# Altium footprint library North POLE.PcbLib: 419 footprints (part 26 of 27)
Each footprint in its own frame and in the unit in brackets; x right, y up, seen from the top. Pads: shape width x height; smd on the part's side, far side on the other; paste and mask are expansions set on the pad; w line width, h text height; cw(c..) or ccw(c..) is an arc to the next point about the centre after c.
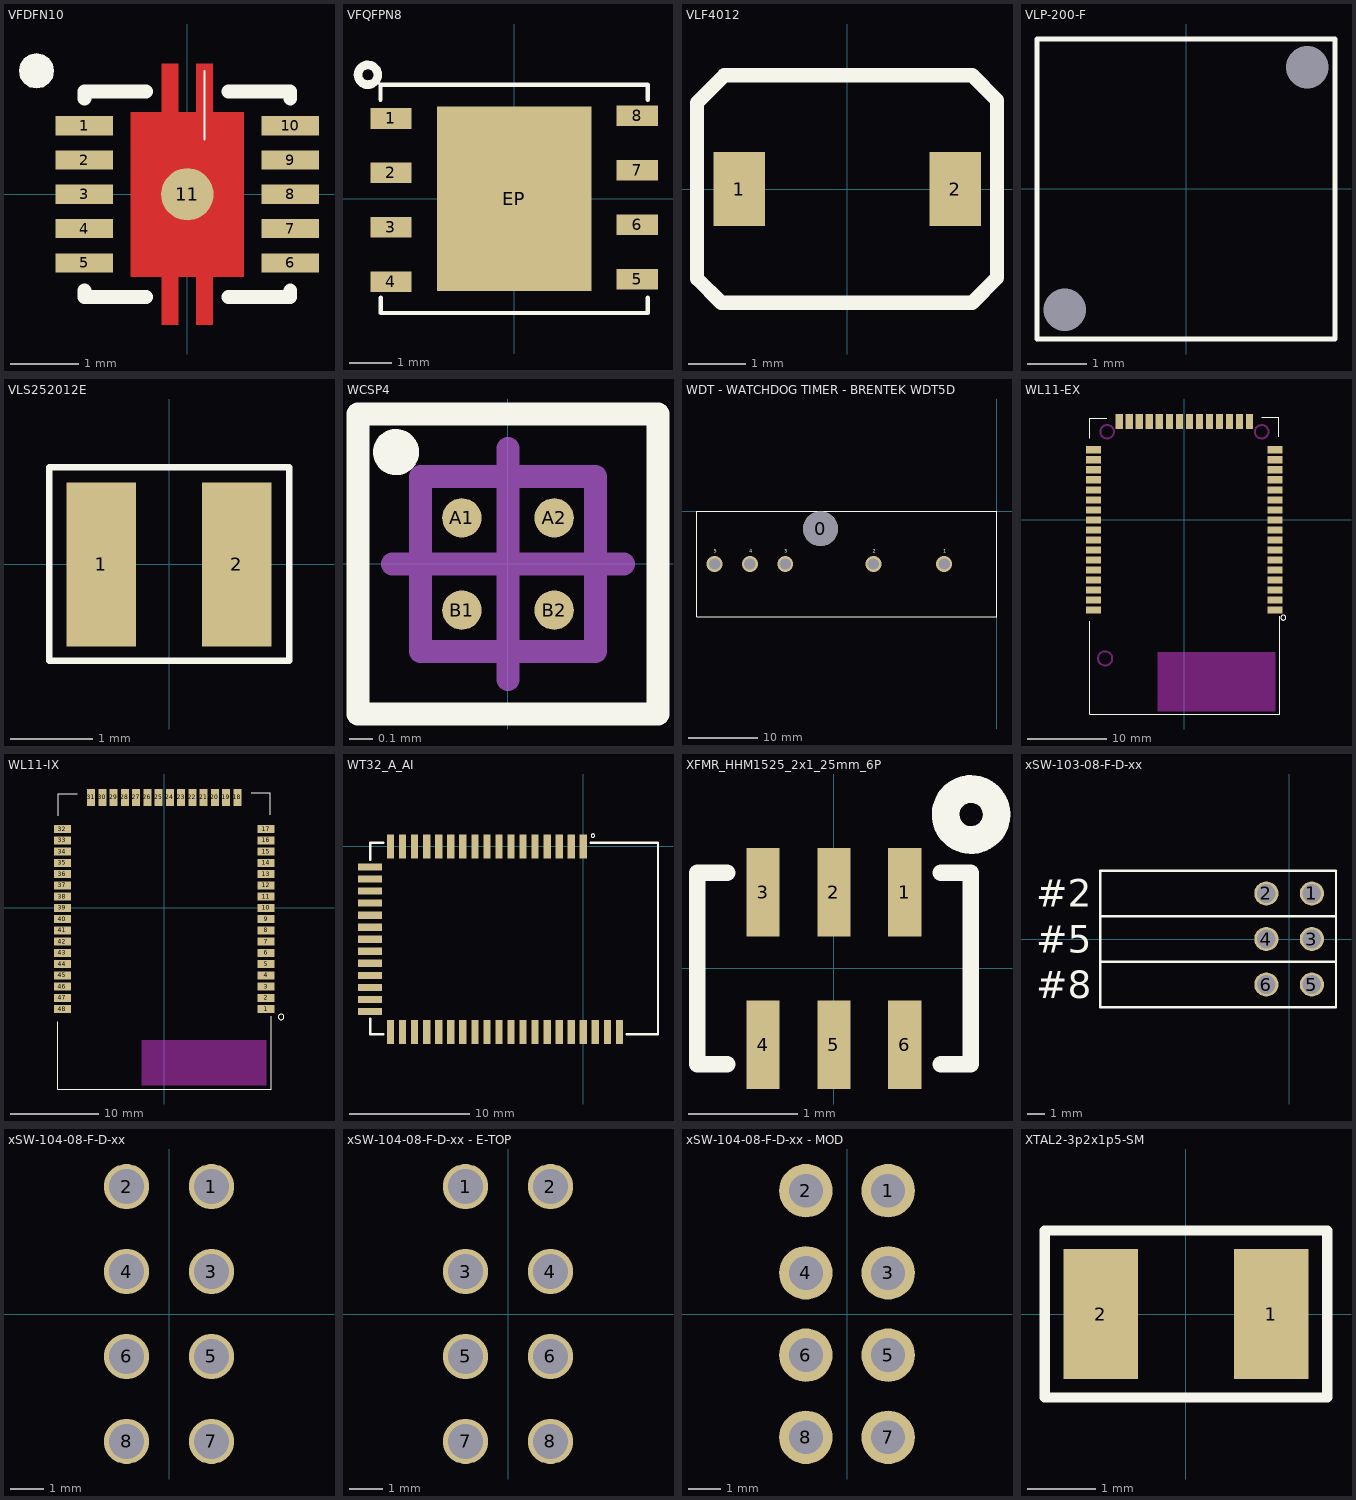
[diagram p25: the footprints below, top view; thin cyan lines are the x and y axes]

## VFDFN10 [mil]
pads (11):
  rect 33x11 smd paste+0 mask+5: 1(-59.06,39.37) 2(-59.06,19.68) 3(-59.06,0) 4(-59.06,-19.68) 5(-59.06,-39.37) 6(59.06,-39.37) 7(59.06,-19.68) 8(59.06,0) 9(59.06,19.68) 10(59.06,39.37)
  round 30 smd paste+0 mask+5: 11(0,0)
Top Layer:
  region: -32.48,-47.24 -32.48,47.24 -14.57,47.24 -14.57,74.8 -5.12,74.8 -5.12,47.24 5.12,47.24 5.12,74.8 14.57,74.8 14.57,47.24 32.48,47.24 32.48,-47.24 14.57,-47.24 14.57,-74.8 5.12,-74.8 5.12,-47.24 -5.12,-47.24 -5.12,-74.8 -14.57,-74.8 -14.57,-47.24
Top Overlay:
  region: -86.61,60.83 -90.45,61.59 -93.71,63.77 -95.89,67.03 -96.65,70.87 -95.89,74.71 -93.71,77.96 -90.45,80.14 -86.61,80.9 -82.77,80.14 -79.52,77.96 -77.34,74.71 -76.58,70.87 -77.34,67.03 -79.52,63.77 -82.77,61.59
  lines w1: 9.84,31.5 9.84,70.87
  lines w8: -59.06,-55.12 -59.06,-59.06 -23.62,-59.06 ; -59.06,55.12 -59.06,59.06 -23.62,59.06 ; 23.62,-59.06 59.06,-59.06 59.06,-55.12 ; 23.62,59.06 59.06,59.06 59.06,55.12
Top Paste:
  region: -27.56,-43.31 27.56,-43.31 27.56,-23.62 -27.56,-23.62
  region: -27.56,23.62 27.56,23.62 27.56,43.31 -27.56,43.31
  region: -27.56,-7.87 27.56,-7.87 27.56,11.81 -27.56,11.81
Top Solder:
  region: -32.48,-47.24 -32.48,47.24 -14.57,47.24 -14.57,74.8 -5.12,74.8 -5.12,47.24 5.12,47.24 5.12,74.8 14.57,74.8 14.57,47.24 32.48,47.24 32.48,-47.24 14.57,-47.24 14.57,-74.8 5.12,-74.8 5.12,-47.24 -5.12,-47.24 -5.12,-74.8 -14.57,-74.8 -14.57,-47.24

## VFQFPN8 [mm]
pads (9):
  rect 0.965x0.48 smd mask+0.08: 1(-2.873,1.875) 2(-2.873,0.605) 3(-2.873,-0.665) 4(-2.873,-1.935) 5(2.873,-1.875) 6(2.873,-0.605) 7(2.873,0.665) 8(2.873,1.935)
  rect 3.6x4.3 smd mask+0.08: EP(0,0)
Top Overlay:
  lines w0.1: -3.119,2.309 -3.119,2.664 3.114,2.664 3.114,2.309 ; -3.114,-2.309 -3.114,-2.664 3.119,-2.664 3.119,-2.309
  lines w0.2: -3.331,3.11 ccw(c-3.411,2.894) -3.327,3.109
3D body: height 0.85, standoff 0, extent -3,-2.5 3,2.5

## VLF4012 [mm] "TDK VLF4012A SMD Inductor"
height 1.2
pads (2):
  rect 0.9x1.3 smd: 1(-1.9,0) 2(1.9,0)
Top Overlay:
  lines w0.254: -2.643,-1.575 -2.218,-2 2.196,-2 2.634,-1.562 2.634,1.562 2.196,2 -2.16,2 -2.643,1.518 -2.643,-1.575
3D body: height 1.2, standoff 0, extent -2.351,-1.721 2.348,1.727

## VLP-200-F [mil]
pads (2):
  round 24 hole 28 unplated mask+3.15: ""(-80,-80) ""(80,80)
Top Overlay:
  lines w3: -98.43,-99.37 98.39,-99.37 98.39,98.78 -98.43,98.78 -98.43,-99.37
3D body: height 399.86, standoff -60.14, extent -92.49,-92.49 92.51,92.51

## VLS252012E [mm]
pads (2):
  rect 0.85x2 smd mask+0.08: 1(-0.825,0) 2(0.825,0)
Top Overlay:
  lines w0.076: -1.456,-1.173 -1.456,1.184 1.463,1.184 1.463,-1.173 -1.456,-1.173
3D body: height 1.2, standoff 0, extent -1.25,-1.002 1.25,1

## WCSP4 [mm] "BGA, 4-Leads, Body 0.76x0.76mmx0.50mm, Pitch 0.40mm"
height 0.5
pads (4):
  round 0.17 smd: A1(-0.2,0.2) A2(0.2,0.2) B1(-0.2,-0.2) B2(0.2,-0.2)
Top Overlay:
  circle w0.1: c-0.485,0.485 r0.05
  lines w0.1: -0.65,-0.65 0.65,-0.65 0.65,0.65 -0.65,0.65 -0.65,-0.65
Mechanical 13:
  lines w0.1: -0.38,-0.38 0.38,-0.38 0.38,0.38 -0.38,0.38 -0.38,-0.38
Mechanical 15:
  lines w0.05: -0.65,-0.65 0.65,-0.65 0.65,0.65 -0.65,0.65 -0.65,-0.65
  lines w0.1: -0.5,0 0.5,0 ; 0,-0.5 0,0.5
3D body: height 0.5, standoff 0.13, extent -0.38,-0.38 0.38,0.38

## WDT - WATCHDOG TIMER - BRENTEK WDT5D [mm]
pads (1):
  round 5 hole 5 unplated: 0(-25.4,-2.54)
via -40.64,-7.62 diameter 2.286 hole 1.651
via -35.56,-7.62 diameter 2.286 hole 1.651
via -30.48,-7.62 diameter 2.286 hole 1.651
via -17.78,-7.62 diameter 2.286 hole 1.651
via -7.62,-7.62 diameter 2.286 hole 1.651
Top Overlay:
  lines w0.127: -43.18,-15.24 -43.18,0 0,0 0,-15.24 -43.18,-15.24
  text "5" at -40.767,-6.02 h0.5
  text "4" at -35.687,-6.02 h0.5
  text "3" at -30.607,-6.02 h0.5
  text "2" at -17.907,-6.02 h0.5
  text "1" at -7.747,-6.02 h0.5

## WL11-EX [mil]
pads (48):
  rect 75x36 smd mask+3.15: 1(452.5,-450) 2(452.5,-400) 3(452.5,-350) 4(452.5,-300) 5(452.5,-250) 6(452.5,-200) 7(452.5,-150) 8(452.5,-100) 9(452.5,-50) 10(452.5,0) 11(452.5,50) 12(452.5,100) 13(452.5,150) 14(452.5,200) 15(452.5,250) 16(452.5,300) 17(452.5,350) 32(-452.5,350) 33(-452.5,300) 34(-452.5,250) 35(-452.5,200) 36(-452.5,150) 37(-452.5,100) 38(-452.5,50) 39(-452.5,0) 40(-452.5,-50) 41(-452.5,-100) 42(-452.5,-150) 43(-452.5,-200) 44(-452.5,-250) 45(-452.5,-300) 46(-452.5,-350) 47(-452.5,-400) 48(-452.5,-450)
  rect 36x75 smd mask+3.15: 18(325,491.06) 19(275,491.06) 20(225,491.06) 21(175,491.06) 22(125,491.06) 23(75,491.06) 24(25,491.06) 25(-25,491.06) 26(-75,491.06) 27(-125,491.06) 28(-175,491.06) 29(-225,491.06) 30(-275,491.06) 31(-325,491.06)
Top Overlay:
  lines w5: -472.7,-506.7 -472.7,-968.5 475.9,-968.5 475.9,-481.5 ; -472,408.6 -472,508.5 -387.4,508.5 ; 387.1,512.2 471.4,512.2 471.4,414.5 ; 502.44,-479.1 ccw(c493.64,-487.91) 504,-481
Keep-Out Layer:
  circle w10: c-385.84,440 r33.86
  circle w10: c385.83,440 r33.86
  circle w10: c-395.48,-691 r35.48
  rectangle: -133.86,-957.1 453.8,-658
3D body: height 37, standoff 0, extent -454,-957.1 453.9,493.2
3D body: height 157.48, standoff 1, extent -407.5,-541.2 405,445.4

## WL11-IX [mil]
pads (48):
  rect 75x36 smd mask+3.15: 1(452.5,-450) 2(452.5,-400) 3(452.5,-350) 4(452.5,-300) 5(452.5,-250) 6(452.5,-200) 7(452.5,-150) 8(452.5,-100) 9(452.5,-50) 10(452.5,0) 11(452.5,50) 12(452.5,100) 13(452.5,150) 14(452.5,200) 15(452.5,250) 16(452.5,300) 17(452.5,350) 32(-452.5,350) 33(-452.5,300) 34(-452.5,250) 35(-452.5,200) 36(-452.5,150) 37(-452.5,100) 38(-452.5,50) 39(-452.5,0) 40(-452.5,-50) 41(-452.5,-100) 42(-452.5,-150) 43(-452.5,-200) 44(-452.5,-250) 45(-452.5,-300) 46(-452.5,-350) 47(-452.5,-400) 48(-452.5,-450)
  rect 36x75 smd mask+3.15: 18(325,491.06) 19(275,491.06) 20(225,491.06) 21(175,491.06) 22(125,491.06) 23(75,491.06) 24(25,491.06) 25(-25,491.06) 26(-75,491.06) 27(-125,491.06) 28(-175,491.06) 29(-225,491.06) 30(-275,491.06) 31(-325,491.06)
Top Overlay:
  lines w5: -472.7,-506.7 -472.7,-804.8 475.9,-804.8 475.9,-481.5 ; -472,408.6 -472,508.5 -387.4,508.5 ; 387.1,512.2 471.4,512.2 471.4,414.5 ; 528.49,-475.45 ccw(c519.68,-484.25) 530.04,-477.35
Keep-Out Layer:
  region: -101.1,-588 -101.1,-788 453.8,-788 453.9,-788.1 453.9,-588
3D body: height 37, standoff 0, extent -454,-788.9 453.9,493.2
3D body: height 157.48, standoff 1, extent -407.5,-541.2 405,445.4
3D body: height 96, standoff 36, extent -262.78,-744.01 -183.09,-664.17

## WT32_A_AI [mm] "Bluegiga WT32 Audio Module"
pads (50):
  rect 0.6x2 smd: 1(0,0) 2(-1,0) 3(-2,0) 4(-3,0) 5(-4,0) 6(-5,0) 7(-6,0) 8(-7,0) 9(-8,0) 10(-9,0) 11(-10,0) 12(-11,0) 13(-12,0) 14(-13,0) 15(-14,0) 16(-15,0) 17(-16,0) 31(-16,-15.4) 32(-15,-15.4) 33(-14,-15.4) 34(-13,-15.4) 35(-12,-15.4) 36(-11,-15.4) 37(-10,-15.4) 38(-9,-15.4) 39(-8,-15.4) 40(-7,-15.4) 41(-6,-15.4) 42(-5,-15.4) 43(-4,-15.4) 44(-3,-15.4) 45(-2,-15.4) 46(-1,-15.4) 47(0,-15.4) 48(1,-15.4) 49(2,-15.4) 50(3,-15.4)
  rect 2x0.6 smd: 18(-17.7,-1.7) 19(-17.7,-2.7) 20(-17.7,-3.7) 21(-17.7,-4.7) 22(-17.7,-5.7) 23(-17.7,-6.7) 24(-17.7,-7.7) 25(-17.7,-8.7) 26(-17.7,-9.7) 27(-17.7,-10.7) 28(-17.7,-11.7) 29(-17.7,-12.7) 30(-17.7,-13.7)
Top Overlay:
  circle w0.051: c0.8,0.9 r0.141
  lines w0.203: -17.7,-14.3 -17.7,-15.6 -16.6,-15.6 ; -17.7,-1.1 -17.7,0.3 -16.6,0.3 ; 0.6,0.3 6.2,0.3 6.2,-15.6 3.6,-15.6

## XFMR_HHM1525_2x1_25mm_6P [mil]
pads (6):
  rect 12x32 smd: 1(25.59,27.52) 2(0,27.52) 3(-25.59,27.52) 4(-25.59,-27.52) 5(0,-27.52) 6(25.59,-27.52)
Top Overlay:
  lines w5.98: -38.58,-34.57 -49.33,-34.57 -49.33,34.57 -38.58,34.57 ; 38.58,-34.57 49.33,-34.57 49.33,34.57 38.58,34.57
  lines w10: 56.03,62.1 ccw(c49.51,55.58) 56.59,61.48

## xSW-103-08-F-D-xx [mil]
pads (6):
  round 53 hole 41: 1(50,100) 2(-50,100) 3(50,0) 4(-50,0) 5(50,-100) 6(-50,-100)
Top Overlay:
  lines w5: -415,-50 103,-50 ; -415,50 103,50 ; -415,-150 103,-150 103,150 -415,150 -415,-150
  text "#5" at -556,-30 h60
  text "#2" at -556,71 h60
  text "#8" at -556,-130 h60

## xSW-104-08-F-D-xx [mil]
pads (8):
  round 53 hole 41: 1(50,150) 2(-50,150) 3(50,50) 4(-50,50) 5(50,-50) 6(-50,-50) 7(50,-150) 8(-50,-150)

## xSW-104-08-F-D-xx - E-TOP [mil]
pads (8):
  round 53 hole 41: 1(-50,150) 2(50,150) 3(-50,50) 4(50,50) 5(-50,-50) 6(50,-50) 7(-50,-150) 8(50,-150)

## xSW-104-08-F-D-xx - MOD [mil]
pads (8):
  round 65 hole 41: 1(50,150) 2(-50,150) 3(50,50) 4(-50,50) 5(50,-50) 6(-50,-50) 7(50,-150) 8(-50,-150)

## XTAL2-3p2x1p5-SM [mil]
pads (2):
  rect 43x75 smd: 1(49.21,0) 2(-49.21,0)
Top Overlay:
  lines w5.98: -81.69,-48.23 81.69,-48.23 81.69,-11.81 81.69,48.23 -81.69,48.23 -81.69,-48.23